# Altium footprint library MercurialSDR.PcbLib: 77 footprints (part 3 of 5) (continued)
## Mercurial_SDR_bottom [mm] (continued)
2.171,-0.919 ; 1.44,-0.95 2.11,-0.95 ; 1.47,-0.553 1.592,-0.553 ; 1.47,-0.523 1.561,-0.523 ; 1.47,-0.492 1.561,-0.492 ; 1.47,-0.462 1.561,-0.462 ; 1.47,-0.432 1.561,-0.432 ; 1.47,-0.401 1.561,-0.401 ; 1.47,-0.371 1.561,-0.371 ; 1.47,-0.34 1.561,-0.34 ; 1.47,-0.31 1.561,-0.31 ; 1.47,-0.279 1.561,-0.279 ; 1.47,-0.249 1.561,-0.249 ; 1.47,-0.218 1.561,-0.218 ; 1.47,-0.188 1.561,-0.188 ; 1.47,-0.157 1.561,-0.157 ; 1.47,-0.127 1.561,-0.127 ; 1.47,-0.096 1.561,-0.096 ; 1.47,-0.066 1.561,-0.066 ; 1.47,-0.035 1.561,-0.035 ; 1.47,-0.005 1.561,-0.005 ; 1.47,0.026 1.561,0.026 ; 1.47,0.056 1.561,0.056 ; 1.47,0.087 1.561,0.087 ; 1.47,0.117 1.561,0.117 ; 1.47,0.148 1.561,0.148 ; 1.47,0.178 1.561,0.178 ; 1.47,0.209 1.561,0.209 ; 1.47,0.239 1.561,0.239 ; 1.47,0.27 1.561,0.27 ; 1.5,-0.614 1.653,-0.614 ; 1.5,-0.584 1.622,-0.584 ; 1.531,-0.98 1.988,-0.98 ; 1.531,-0.645 2.019,-0.645 ; 1.561,-0.675 1.988,-0.675 ; 1.622,-0.706 1.927,-0.706 ; 1.897,-0.614 2.019,-0.614 ; 1.927,-0.584 2.049,-0.584 ; 1.958,-0.553 2.049,-0.553 ; 1.958,-0.523 2.049,-0.523 ; 1.988,-0.889 2.232,-0.889 ; 1.988,-0.492 2.049,-0.492 ; 1.988,-0.462 2.049,-0.462 ; 1.988,-0.432 2.049,-0.432 ; 1.988,-0.401 2.049,-0.401 ; 1.988,-0.371 2.049,-0.371 ; 1.988,-0.34 2.049,-0.34 ; 1.988,-0.31 2.049,-0.31 ; 1.988,-0.279 2.049,-0.279 ; 1.988,-0.249 2.049,-0.249 ; 1.988,-0.218 2.049,-0.218 ; 1.988,-0.188 2.049,-0.188 ; 1.988,-0.157 2.049,-0.157 ; 1.988,-0.127 2.049,-0.127 ; 1.988,-0.096 2.049,-0.096 ; 1.988,-0.066 2.049,-0.066 ; 1.988,-0.035 2.049,-0.035 ; 1.988,-0.005 2.049,-0.005 ; 1.988,0.026 2.049,0.026 ; 1.988,0.056 2.049,0.056 ; 1.988,0.087 2.049,0.087 ; 1.988,0.117 2.049,0.117 ; 1.988,0.148 2.049,0.148 ; 1.988,0.178 2.049,0.178 ; 1.988,0.209 2.049,0.209 ; 1.988,0.239 2.049,0.239 ; 1.988,0.27 2.049,0.27 ; 1.988,0.3 3.421,0.3 ; 1.988,0.33 3.299,0.33 ; 2.08,-0.858 2.262,-0.858 ; 2.141,-0.828 2.293,-0.828 ; 2.171,-0.797 2.323,-0.797 ; 2.202,-0.767 2.354,-0.767 ; 2.232,-0.736 2.354,-0.736 ; 2.262,-0.706 2.384,-0.706 ; 2.293,-0.675 2.384,-0.675 ; 2.293,-0.645 2.415,-0.645 ; 2.323,-0.614 2.415,-0.614 ; 2.323,-0.584 2.415,-0.584 ; 2.323,-0.553 2.415,-0.553 ; 2.354,-0.523 2.445,-0.523 ; 2.354,-0.492 2.445,-0.492 ; 2.354,-0.462 2.445,-0.462 ; 2.354,-0.432 2.445,-0.432 ; 2.354,-0.401 2.445,-0.401 ; 2.354,-0.371 2.445,-0.371 ; 2.354,-0.34 2.445,-0.34 ; 2.354,-0.31 2.445,-0.31 ; 2.354,-0.279 2.445,-0.279 ; 2.354,-0.249 2.445,-0.249 ; 2.354,-0.218 2.445,-0.218 ; 2.354,-0.188 2.445,-0.188 ; 2.354,-0.157 2.445,-0.157 ; 2.354,-0.127 2.445,-0.127 ; 2.354,-0.096 2.445,-0.096 ; 2.354,-0.066 2.445,-0.066 ; 2.354,-0.035 3.268,-0.035 ; 2.354,-0.005 3.177,-0.005 ; 2.354,0.026 2.537,0.026 ; 2.354,0.056 2.537,0.056 ; 2.354,0.087 2.537,0.087 ; 2.354,0.117 2.537,0.117 ; 2.354,0.148 2.537,0.148 ; 2.354,0.178 2.537,0.178 ; 2.354,0.209 2.537,0.209 ; 2.354,0.239 2.537,0.239 ; 2.354,0.27 2.537,0.27 ; 2.445,-0.95 3.299,-0.95 ; 2.445,-0.919 3.39,-0.919 ; 2.445,-0.889 2.537,-0.889 ; 2.445,-0.858 2.537,-0.858 ; 2.445,-0.828 2.537,-0.828 ; 2.445,-0.797 2.537,-0.797 ; 2.445,-0.767 2.537,-0.767 ; 2.445,-0.736 2.537,-0.736 ; 2.445,-0.706 2.537,-0.706 ; 2.445,-0.675 2.537,-0.675 ; 2.445,-0.645 2.537,-0.645 ; 2.445,-0.614 3.207,-0.614 ; 2.445,-0.584 3.299,-0.584 ; 2.903,-0.066 3.299,-0.066 ; 2.933,-0.553 3.329,-0.553 ; 3.055,-0.889 3.482,-0.889 ; 3.055,0.27 3.482,0.27 ; 3.177,-0.523 3.36,-0.523 ; 3.177,-0.096 3.329,-0.096 ; 3.238,-0.492 3.36,-0.492 ; 3.238,-0.127 3.36,-0.127 ; 3.268,-0.858 3.543,-0.858 ; 3.268,-0.462 3.39,-0.462 ; 3.268,-0.157 3.39,-0.157 ; 3.299,-0.432 3.39,-0.432 ; 3.299,-0.401 3.39,-0.401 ; 3.299,-0.218 3.39,-0.218 ; 3.299,-0.188 3.39,-0.188 ; 3.299,0.239 3.543,0.239 ; 3.329,-0.371 3.39,-0.371 ; 3.329,-0.34 3.39,-0.34 ; 3.329,-0.31 3.421,-0.31 ; 3.329,-0.279 3.39,-0.279 ; 3.329,-0.249 3.39,-0.249 ; 3.36,-0.828 3.573,-0.828 ; 3.39,0.209 3.573,0.209 ; 3.451,-0.797 3.604,-0.797 ; 3.451,0.178 3.634,0.178 ; 3.482,-0.767 3.634,-0.767 ; 3.512,0.148 3.665,0.148 ; 3.543,-0.736 3.665,-0.736 ; 3.543,0.117 3.695,0.117 ; 3.573,-0.706 3.695,-0.706 ; 3.573,0.087 3.695,0.087 ; 3.604,-0.675 3.726,-0.675 ; 3.604,0.056 3.726,0.056 ; 3.634,-0.645 3.726,-0.645 ; 3.634,0.026 3.756,0.026 ; 3.665,-0.614 3.756,-0.614 ; 3.665,-0.584 3.756,-0.584 ; 3.665,-0.035 3.786,-0.035 ; 3.665,-0.005 3.756,-0.005 ; 3.695,-0.553 3.786,-0.553 ; 3.695,-0.523 3.786,-0.523 ; 3.695,-0.492 3.786,-0.492 ; 3.695,-0.096 3.786,-0.096 ; 3.695,-0.066 3.786,-0.066 ; 3.726,-0.462 3.817,-0.462 ; 3.726,-0.432 3.817,-0.432 ; 3.726,-0.401 3.817,-0.401 ; 3.726,-0.371 3.817,-0.371 ; 3.726,-0.34 3.817,-0.34 ; 3.726,-0.31 3.817,-0.31 ; 3.726,-0.279 3.817,-0.279 ; 3.726,-0.249 3.817,-0.249 ; 3.726,-0.218 3.817,-0.218 ; 3.726,-0.188 3.817,-0.188 ; 3.726,-0.157 3.817,-0.157 ; 3.726,-0.127 3.817,-0.127 ; 3.817,-0.95 4.335,-0.95 ; 3.817,-0.919 4.366,-0.919 ; 3.817,-0.889 3.908,-0.889 ; 3.817,-0.858 3.908,-0.858 ; 3.817,-0.828 3.908,-0.828 ; 3.817,-0.797 3.908,-0.797 ; 3.817,-0.767 3.908,-0.767 ; 3.817,-0.736 3.908,-0.736 ; 3.817,-0.706 3.908,-0.706 ; 3.817,-0.675 3.908,-0.675 ; 3.817,-0.645 3.908,-0.645 ; 3.817,-0.614 4.244,-0.614 ; 3.817,-0.584 4.274,-0.584 ; 3.878,-0.127 3.969,-0.127 ; 3.878,-0.096 3.969,-0.096 ; 3.878,-0.066 3.969,-0.066 ; 3.878,-0.035 3.969,-0.035 ; 3.878,-0.005 3.969,-0.005 ; 3.878,0.026 3.969,0.026 ; 3.908,-0.218 4,-0.218 ; 3.908,-0.188 4,-0.188 ; 3.908,-0.157 4,-0.157 ; 3.908,0.056 4,0.056 ; 3.908,0.087 4,0.087 ; 3.908,0.117 4.03,0.117 ; 3.939,-0.279 4.061,-0.279 ; 3.939,-0.249 4.03,-0.249 ; 3.939,0.148 4.061,0.148 ; 3.939,0.178 4.091,0.178 ; 3.969,-0.31 4.091,-0.31 ; 3.969,0.209 4.122,0.209 ; 4,-0.34 4.152,-0.34 ; 4,0.239 4.213,0.239 ; 4.03,-0.371 4.244,-0.371 ; 4.061,0.27 4.335,0.27 ; 4.091,-0.401 4.335,-0.401 ; 4.091,0.3 5.219,0.3 ; 4.152,-0.553 4.305,-0.553 ; 4.183,-0.523 4.305,-0.523 ; 4.183,-0.432 4.335,-0.432 ; 4.183,0.33 5.219,0.33 ; 4.213,-0.492 4.335,-0.492 ; 4.244,-0.889 4.396,-0.889 ; 4.244,-0.462 4.335,-0.462 ; 4.244,-0.127 4.335,-0.127 ; 4.244,-0.096 4.335,-0.096 ; 4.274,-0.858 4.427,-0.858 ; 4.274,-0.188 4.762,-0.188 ; 4.274,-0.157 4.396,-0.157 ; 4.274,-0.066 4.366,-0.066 ; 4.274,-0.035 4.396,-0.035 ; 4.274,-0.005 4.762,-0.005 ; 4.305,-0.828 4.457,-0.828 ; 4.305,-0.218 4.762,-0.218 ; 4.305,0.026 4.762,0.026 ; 4.335,-0.797 4.488,-0.797 ; 4.366,-0.767 4.518,-0.767 ; 4.396,-0.736 4.548,-0.736 ; 4.427,-0.706 4.579,-0.706 ; 4.457,-0.675 4.609,-0.675 ; 4.488,-0.645 4.64,-0.645 ; 4.518,-0.614 4.67,-0.614 ; 4.548,-0.584 4.792,-0.584 ; 4.579,-0.553 4.792,-0.553 ; 4.609,-0.523 4.792,-0.523 ; 4.64,-0.492 4.792,-0.492 ; 4.67,-0.462 4.792,-0.462 ; 4.67,-0.157 4.762,-0.157 ; 4.67,-0.127 4.762,-0.127 ; 4.67,-0.096 4.762,-0.096 ; 4.67,-0.066 4.762,-0.066 ; 4.67,-0.035 4.762,-0.035 ; 4.701,-0.95 5.219,-0.95 ; 4.701,-0.919 5.219,-0.919 ; 4.701,-0.889 4.792,-0.889 ; 4.701,-0.858 4.792,-0.858 ; 4.701,-0.828 4.792,-0.828 ; 4.701,-0.797 4.792,-0.797 ; 4.701,-0.767 4.792,-0.767 ; 4.701,-0.736 4.792,-0.736 ; 4.701,-0.706 4.792,-0.706 ; 4.701,-0.675 4.792,-0.675 ; 4.701,-0.645 4.792,-0.645 ; 4.701,-0.614 4.792,-0.614 ; 5.128,-0.889 5.219,-0.889 ; 5.128,-0.858 5.219,-0.858 ; 5.128,-0.828 5.219,-0.828 ; 5.128,-0.797 5.219,-0.797 ; 5.128,-0.767 5.219,-0.767 ; 5.128,-0.736 5.219,-0.736 ; 5.128,-0.706 5.219,-0.706 ; 5.128,-0.675 5.219,-0.675 ; 5.128,-0.645 5.219,-0.645 ; 5.128,-0.614 5.219,-0.614 ; 5.128,-0.584 5.219,-0.584 ; 5.128,-0.553 5.219,-0.553 ; 5.128,-0.523 5.219,-0.523 ; 5.128,-0.492 5.219,-0.492 ; 5.128,-0.462 5.219,-0.462 ; 5.128,-0.432 5.219,-0.432 ; 5.128,-0.401 5.219,-0.401 ; 5.128,-0.371 5.219,-0.371 ; 5.128,-0.34 5.219,-0.34 ; 5.128,-0.31 5.219,-0.31 ; 5.128,-0.279 5.219,-0.279 ; 5.128,-0.249 5.219,-0.249 ; 5.128,-0.218 5.219,-0.218 ; 5.128,-0.188 5.219,-0.188 ; 5.128,-0.157 5.219,-0.157 ; 5.128,-0.127 5.219,-0.127 ; 5.128,-0.096 5.219,-0.096 ; 5.128,-0.066 5.219,-0.066 ; 5.128,-0.035 5.219,-0.035 ; 5.128,-0.005 5.219,-0.005 ; 5.128,0.026 5.219,0.026 ; 5.128,0.056 5.219,0.056 ; 5.128,0.087 5.219,0.087 ; 5.128,0.117 5.219,0.117 ; 5.128,0.148 5.219,0.148 ; 5.128,0.178 5.219,0.178 ; 5.128,0.209 5.219,0.209 ; 5.128,0.239 5.219,0.239 ; 5.128,0.27 5.219,0.27 ; 5.25,-0.95 6.926,-0.95 ; 5.25,-0.919 6.926,-0.919 ; 5.25,-0.889 5.341,-0.889 ; 5.25,-0.858 5.341,-0.858 ; 5.25,-0.828 5.341,-0.828 ; 5.25,-0.797 5.341,-0.797 ; 5.25,-0.767 5.341,-0.767 ; 5.25,-0.736 5.341,-0.736 ; 5.25,-0.706 5.341,-0.706 ; 5.25,-0.675 5.341,-0.675 ; 5.25,-0.645 5.341,-0.645 ; 5.25,-0.614 6.072,-0.614 ; 5.25,-0.584 6.072,-0.584 ; 5.31,-0.035 6.072,-0.035 ; 5.31,-0.005 6.072,-0.005 ; 5.31,0.026 5.371,0.026 ; 5.31,0.056 5.371,0.056 ; 5.31,0.087 5.371,0.087 ; 5.31,0.117 5.371,0.117 ; 5.31,0.148 5.371,0.148 ; 5.31,0.178 5.371,0.178 ; 5.31,0.209 5.371,0.209 ; 5.31,0.239 5.371,0.239 ; 5.31,0.27 5.371,0.27 ; 5.31,0.3 6.956,0.3 ; 5.31,0.33 6.926,0.33 ; 5.554,-0.401 6.072,-0.401 ; 5.554,-0.371 6.072,-0.371 ; 5.554,-0.34 5.646,-0.34 ; 5.554,-0.31 5.646,-0.31 ; 5.554,-0.279 5.646,-0.279 ; 5.554,-0.249 6.072,-0.249 ; 5.554,-0.218 6.072,-0.218 ; 6.012,-0.553 6.072,-0.553 ; 6.012,-0.523 6.072,-0.523 ; 6.012,-0.492 6.072,-0.492 ; 6.012,-0.462 6.072,-0.462 ; 6.012,-0.432 6.072,-0.432 ; 6.012,-0.188 6.072,-0.188 ; 6.012,-0.157 6.072,-0.157 ; 6.012,-0.127 6.072,-0.127 ; 6.012,-0.096 6.072,-0.096 ; 6.012,-0.066 6.072,-0.066 ; 6.377,-0.889 6.469,-0.889 ; 6.377,-0.858 6.469,-0.858 ; 6.377,-0.828 6.469,-0.828 ; 6.377,-0.797 6.469,-0.797 ; 6.377,-0.767 6.469,-0.767 ; 6.377,-0.736 6.469,-0.736 ; 6.377,-0.706 6.469,-0.706 ; 6.377,-0.675 6.469,-0.675 ; 6.377,-0.645 6.469,-0.645 ; 6.377,-0.614 6.53,-0.614 ; 6.377,-0.584 6.53,-0.584 ; 6.377,-0.553 6.53,-0.553 ; 6.377,-0.523 6.53,-0.523 ; 6.377,-0.492 6.53,-0.492 ; 6.377,-0.462 6.53,-0.462 ; 6.377,-0.432 6.53,-0.432 ; 6.377,-0.401 6.53,-0.401 ; 6.377,-0.371 6.53,-0.371 ; 6.377,-0.34 6.53,-0.34 ; 6.377,-0.31 6.53,-0.31 ; 6.377,-0.279 6.53,-0.279 ; 6.377,-0.249 6.53,-0.249 ; 6.377,-0.218 6.53,-0.218 ; 6.377,-0.188 6.53,-0.188 ; 6.377,-0.157 6.53,-0.157 ; 6.377,-0.127 6.53,-0.127 ; 6.377,-0.096 6.53,-0.096 ; 6.377,-0.066 6.53,-0.066 ; 6.377,-0.035 6.53,-0.035 ; 6.377,-0.005 6.53,-0.005 ; 6.377,0.026 6.53,0.026 ; 6.377,0.056 6.469,0.056 ; 6.377,0.087 6.469,0.087 ; 6.377,0.117 6.469,0.117 ; 6.377,0.148 6.469,0.148 ; 6.377,0.178 6.469,0.178 ; 6.377,0.209 6.469,0.209 ; 6.377,0.239 6.469,0.239 ; 6.377,0.27 6.469,0.27 ; 6.834,-0.889 6.926,-0.889 ; 6.834,-0.858 6.926,-0.858 ; 6.834,-0.828 6.926,-0.828 ; 6.834,-0.797 6.926,-0.797 ; 6.834,-0.767 6.926,-0.767 ; 6.834,-0.736 6.926,-0.736 ; 6.834,-0.706 6.926,-0.706 ; 6.834,-0.675 6.926,-0.675 ; 6.834,-0.645 6.926,-0.645 ; 6.834,-0.614 6.926,-0.614 ; 6.834,-0.584 6.926,-0.584 ; 6.834,-0.553 6.926,-0.553 ; 6.834,-0.523 7.048,-0.523 ; 6.834,-0.492 7.017,-0.492 ; 6.834,-0.462 7.017,-0.462 ; 6.834,-0.432 6.987,-0.432 ; 6.834,-0.401 6.987,-0.401 ; 6.834,-0.371 6.956,-0.371 ; 6.865,0.239 6.987,0.239 ; 6.865,0.27 6.956,0.27 ; 6.895,0.178 7.017,0.178 ; 6.895,0.209 6.987,0.209 ; 6.926,0.117 7.048,0.117 ; 6.926,0.148 7.017,0.148 ; 6.956,-0.584 7.078,-0.584 ; 6.956,-0.553 7.048,-0.553 ; 6.956,0.087 7.048,0.087 ; 6.987,-0.645 7.109,-0.645 ; 6.987,-0.614 7.078,-0.614 ; 6.987,0.026 7.078,0.026 ; 6.987,0.056 7.078,0.056 ; 7.017,-0.706 7.139,-0.706 ; 7.017,-0.675 7.109,-0.675 ; 7.017,-0.035 7.109,-0.035 ; 7.017,-0.005 7.109,-0.005 ; 7.048,-0.767 7.17,-0.767 ; 7.048,-0.736 7.139,-0.736 ; 7.048,-0.096 7.17,-0.096 ; 7.048,-0.066 7.139,-0.066 ; 7.078,-0.828 7.292,-0.828 ; 7.078,-0.797 7.17,-0.797 ; 7.078,-0.157 7.292,-0.157 ; 7.078,-0.127 7.17,-0.127 ; 7.109,-0.889 7.261,-0.889 ; 7.109,-0.858 7.261,-0.858 ; 7.109,-0.218 7.261,-0.218 ; 7.109,-0.188 7.292,-0.188 ; 7.139,-0.95 7.231,-0.95 ; 7.139,-0.919 7.231,-0.919 ; 7.139,-0.279 7.231,-0.279 ; 7.139,-0.249 7.231,-0.249 ; 7.2,-0.797 7.292,-0.797 ; 7.2,-0.127 7.322,-0.127 ; 7.231,-0.767 7.322,-0.767 ; 7.231,-0.736 7.322,-0.736 ; 7.231,-0.096 7.322,-0.096 ; 7.231,-0.066 7.353,-0.066 ; 7.261,-0.706 7.353,-0.706 ; 7.261,-0.675 7.383,-0.675 ; 7.261,-0.035 7.353,-0.035 ; 7.261,-0.005 7.383,-0.005 ; 7.292,-0.645 7.383,-0.645 ; 7.292,-0.614 7.414,-0.614 ; 7.292,0.026 7.383,0.026 ; 7.292,0.056 7.414,0.056 ; 7.322,-0.584 7.414,-0.584 ; 7.322,-0.553 7.444,-0.553 ; 7.322,0.087 7.414,0.087 ; 7.353,-0.523 7.444,-0.523 ; 7.353,-0.492 7.536,-0.492 ; 7.353,0.117 7.444,0.117 ; 7.353,0.148 7.444,0.148 ; 7.383,-0.462 7.536,-0.462 ; 7.383,-0.432 7.536,-0.432 ; 7.383,0.178 7.475,0.178 ; 7.383,0.209 7.475,0.209 ; 7.414,-0.401 7.536,-0.401 ; 7.414,-0.371 7.536,-0.371 ; 7.414,0.239 7.505,0.239 ; 7.414,0.27 7.536,0.27 ; 7.444,-0.34 7.536,-0.34 ; 7.444,0.3 7.932,0.3 ; 7.444,0.33 7.932,0.33 ; 7.475,-0.95 7.932,-0.95 ; 7.475,-0.919 7.932,-0.919 ; 7.475,-0.889 7.536,-0.889 ; 7.475,-0.858 7.536,-0.858 ; 7.475,-0.828 7.536,-0.828 ; 7.475,-0.797 7.536,-0.797 ; 7.475,-0.767 7.536,-0.767 ; 7.475,-0.736 7.536,-0.736 ; 7.475,-0.706 7.536,-0.706 ; 7.475,-0.675 7.536,-0.675 ; 7.475,-0.645 7.536,-0.645 ; 7.475,-0.614 7.536,-0.614 ; 7.475,-0.584 7.536,-0.584 ; 7.475,-0.553 7.536,-0.553 ; 7.475,-0.523 7.536,-0.523 ; 7.84,-0.614 7.932,-0.614 ; 7.84,-0.584 7.932,-0.584 ; 7.84,-0.553 7.932,-0.553 ; 7.84,-0.523 7.932,-0.523 ; 7.84,-0.492 7.932,-0.492 ; 7.84,-0.462 7.932,-0.462 ; 7.84,-0.432 7.932,-0.432 ; 7.84,-0.401 7.932,-0.401 ; 7.84,-0.371 7.932,-0.371 ; 7.84,-0.34 7.932,-0.34 ; 7.84,-0.31 7.932,-0.31 ; 7.84,-0.279 7.932,-0.279 ; 7.84,-0.249 7.932,-0.249 ; 7.84,-0.218 7.932,-0.218 ; 7.84,-0.188 7.932,-0.188 ; 7.84,-0.157 7.932,-0.157 ; 7.84,-0.127 7.932,-0.127 ; 7.84,-0.096 7.932,-0.096 ; 7.84,-0.066 7.932,-0.066 ; 7.84,-0.035 7.932,-0.035 ; 7.84,-0.005 7.932,-0.005 ; 7.84,0.026 7.932,0.026

## Mercurial_SDR_Overlay [mm]
Top Overlay:
  drawing of 1196 lines, arcs and shapes, not listed

## MSOP-8 [mm]
pads (9):
  rect 1.28x0.42 smd: 1(-2.39,0.975) 2(-2.39,0.325) 3(-2.39,-0.325) 4(-2.39,-0.975) 5(2.39,-0.975) 6(2.39,-0.325) 7(2.39,0.325) 8(2.39,0.975)
  rect 2.4x2.35 smd: 2(0,0)
Top Overlay:
  circle w1: c-2.25,2.1 r0.05
  lines w0.127: -1.6,-1.3 -1.6,-1.5 1.6,-1.5 1.6,-1.3 ; -1.6,1.3 -1.6,1.5 1.6,1.5 1.6,1.3
3D body "User Library-MSOP8.step": height 1, standoff -0.1, extent -2.469,-1.55 2.469,1.55

## PCM1781 SSOP-16 [mm] "DAC PCM1781 SSOP-16"
pads (16):
  rect 1.6x0.41 smd: 1(-2.7,2.222) 2(-2.7,1.587) 3(-2.7,0.953) 4(-2.7,0.318) 5(-2.7,-0.318) 6(-2.7,-0.953) 7(-2.7,-1.587) 8(-2.7,-2.222) 9(2.7,-2.222) 10(2.7,-1.587) 11(2.7,-0.953) 12(2.7,-0.318) 13(2.7,0.318) 14(2.7,0.953) 15(2.7,1.587) 16(2.7,2.222)
Top Overlay:
  circle w0.5: c-2.7,3.2 r0.25
  lines w0.127: -2,-2.75 2,-2.75 ; -2,2.75 2,2.75
3D body "User Library-ssop-16 pos.step": height 0.5, standoff -0.6, extent -2.997,-2.467 2.997,2.512

## PCM1802_TSSOP20 [mm] "ADC PCM1802 TSSOP20"
pads (20):
  rect 1.85x0.45 smd: 1(-3.5,2.925) 2(-3.5,2.275) 3(-3.5,1.625) 4(-3.5,0.975) 5(-3.5,0.325) 6(-3.5,-0.325) 7(-3.5,-0.975) 8(-3.5,-1.625) 9(-3.5,-2.275) 10(-3.5,-2.925) 11(3.5,-2.925) 12(3.5,-2.275) 13(3.5,-1.625) 14(3.5,-0.975) 15(3.5,-0.325) 16(3.5,0.325) 17(3.5,0.975) 18(3.5,1.625) 19(3.5,2.275) 20(3.5,2.925)
Top Overlay:
  circle w0.5: c-3.6,4.1 r0.25
  lines w0.127: -2.6,-3.4 -2.6,-3.75 2.6,-3.75 2.6,-3.4 ; -2.6,3.4 -2.6,3.75 2.6,3.75 2.6,3.4
3D body "User Library-TSSOP20_TP.STEP": height 1.1, standoff -0.09, extent -3.18,-3.35 3.1,3.15

## POLISWITCH [mm] "Poliswitch 0ZCG0125AF2B"
pads (2):
  rect 1.78x3.5 smd: 1(-2.625,0) 2(2.625,0)
Top Overlay:
  lines w0.127: -2.375,-2 2.325,-2 ; -2.325,1.9 2.325,1.9
3D body "User Library-Poliswitch_0ZCG-1_35mm_V2.step": height 1.55, standoff 0, extent -2.39,-1.705 2.34,1.705

## POTE_DUAL_TH [mm] "Potenciometro Dual Through Hole"
pads (6):
  round 1.8 hole 1.1 unplated: 1(-5,-2.5) 2(0,-2.5) 3(5,-2.5) 4(-5,2.5) 5(0,2.5) 6(5,2.5)
Top Overlay:
  lines w0.127: -8.6,-4.5 -8.6,4.8 8.6,4.8 8.6,-4.5
Mechanical 15:
  lines w0.127: -8.6,-36.2 -8.6,4.9 8.6,4.9 8.6,-36.2 -8.6,-36.2
3D body "User Library-PotenciometroDual.step": height 21.5, standoff -3, extent -8.5,-36.1 8.5,4.75

## RES_0603 [mm] "Resistor SMD 0603"
pads (2):
  rect 1.1x1 smd: 1(-0.85,0) 2(0.85,0)
Top Overlay:
  lines w0.127: -0.9,-0.7 0.9,-0.7 ; -0.9,0.7 0.9,0.7
3D body "User Library-RES_2013-0603.step": height 0.3, standoff 0, extent -0.8,-0.4 0.8,0.4